# Altium footprint library rt10.PcbLib: 64 footprints (part 3 of 4)
Each footprint in its own frame and in the unit in brackets; x right, y up, seen from the top. Pads: shape width x height; smd on the part's side, far side on the other; paste and mask are expansions set on the pad; w line width, h text height; cw(c..) or ccw(c..) is an arc to the next point about the centre after c.
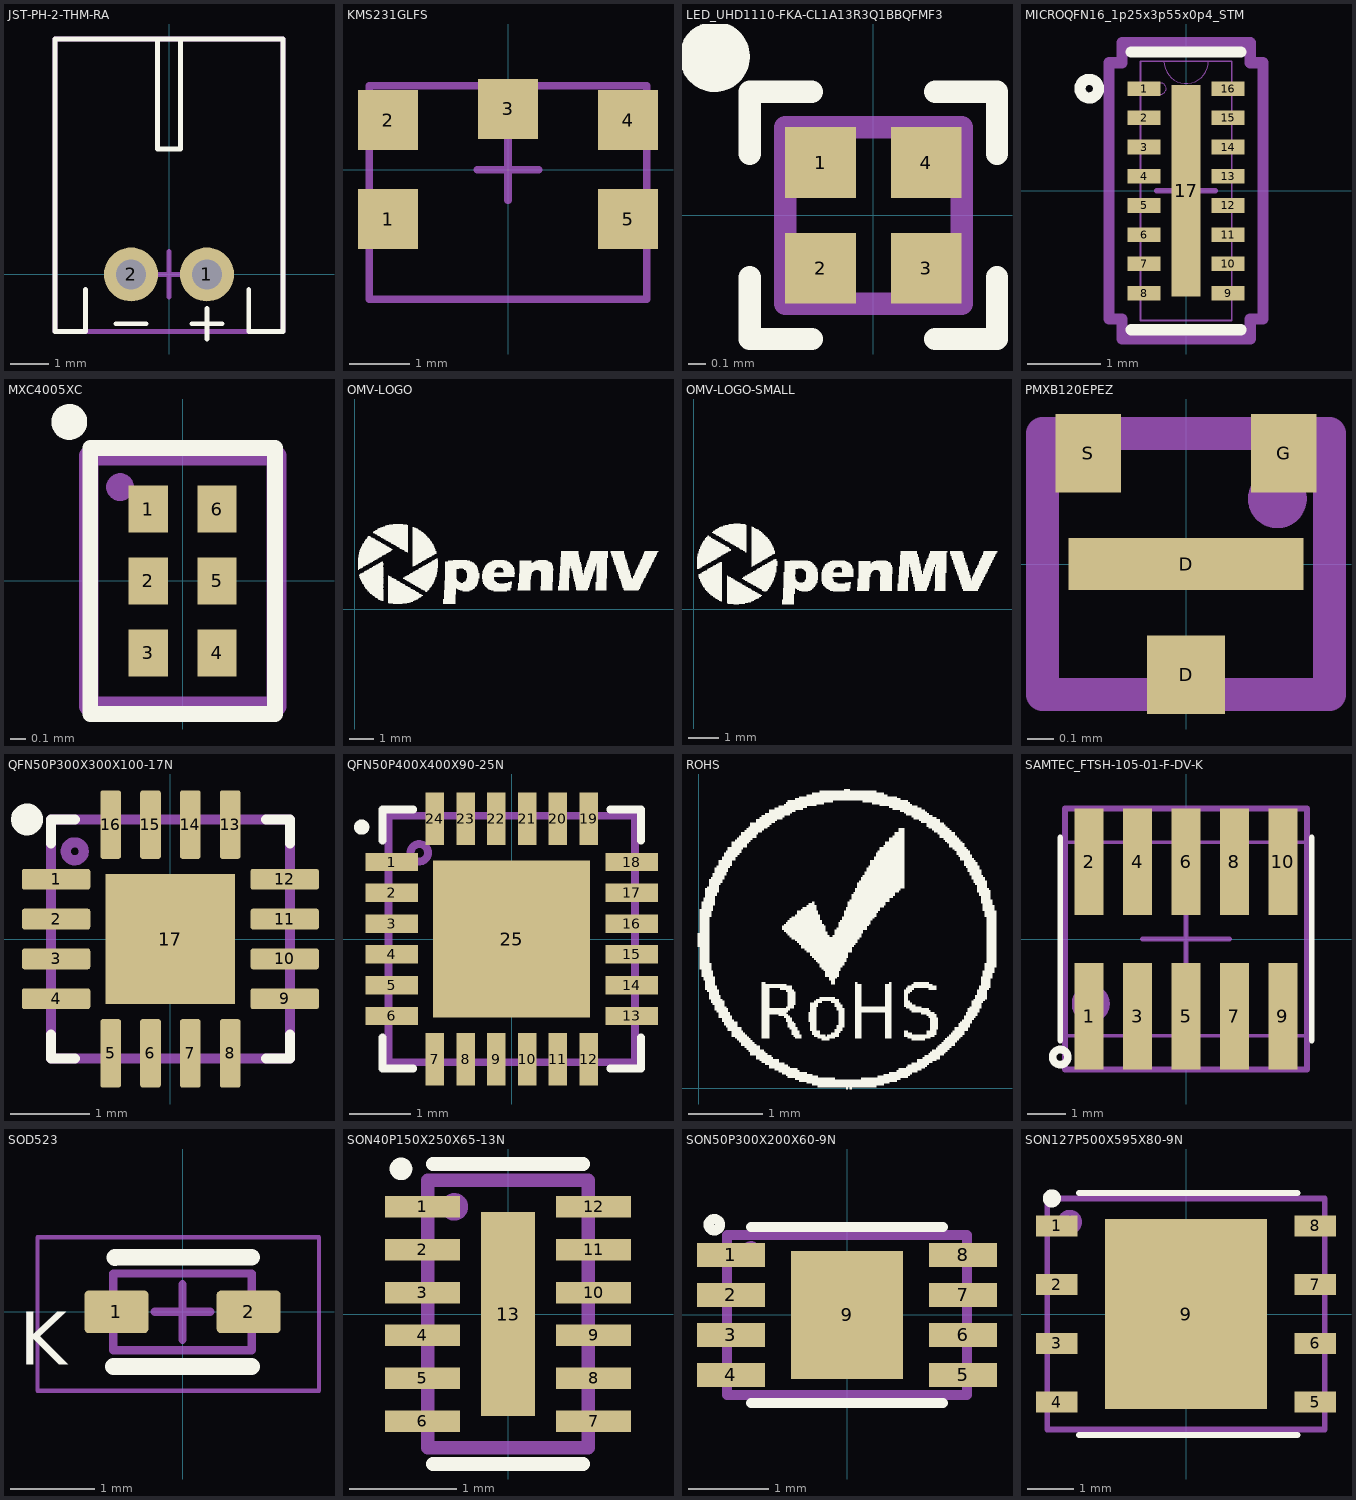
[diagram p2: the footprints below, top view; thin cyan lines are the x and y axes]

## JST-PH-2-THM-RA [mil] "JST-PH-2-THM-RA"
pads (2):
  round 56 hole 31.5: 1(39.37,0) 2(-39.37,0)
Top Overlay:
  lines w5: -86.61,-15.75 -86.61,-59.06 -118.11,-59.06 -118.11,244.09 118.11,244.09 118.11,-59.06 86.61,-59.06 82.68,-59.06 82.68,-15.75 ; -55.12,-51.18 -23.62,-51.18 ; -11.81,244.09 -11.81,129.92 11.81,129.92 11.81,244.09 ; 23.62,-51.18 55.12,-51.18 ; 39.37,-66.93 39.37,-35.43
Mechanical 13:
  lines w5: -23.62,0 0,0 ; 0,-23.62 0,0 ; 0,23.62 0,0 ; 23.62,0 0,0 ; -118.11,-59.06 118.11,-59.06 118.11,244.09 -118.11,244.09 -118.11,-59.06
  text ".designator" at -90.55,49.2 h25
3D body "c-440055-2-b3-3d.stp": height 195.38, standoff -133.36, extent -118.11,-59.06 118.11,244.09

## KMS231GLFS [mm]
pads (5):
  rect 1x1 smd: 1(-2,-0.825) 2(-2,0.825) 3(0,1.016) 4(2,0.825) 5(2,-0.825)
Mechanical 13:
  lines w0.127: -0.508,0 0,0 ; 0,-0.508 0,0 ; 0,0.508 0,0 ; 0.508,0 0,0 ; -2.311,-2.159 -2.311,1.397 2.311,1.397 2.311,-2.159 -2.311,-2.159
  text ".designator" at -2.108,-2.277 h0.64
3D body "KMS231GLFS.stp": height 1.43, standoff -0.01, extent -2.3,-2.15 2.3,1.4

## LED_UHD1110-FKA-CL1A13R3Q1BBQFMF3 [mm] "LED_UHD1110-FKA-CL1A13R3Q1BBQFMF3"
pads (4):
  rect 0.4x0.4 smd: 1(-0.3,0.3) 2(-0.3,-0.3) 3(0.3,-0.3) 4(0.3,0.3)
Top Overlay:
  circle w0.2: c-0.9,0.9 r0.1
  lines w0.127: -0.7,-0.35 -0.7,-0.7 -0.35,-0.7 ; -0.7,0.35 -0.7,0.7 -0.35,0.7 ; 0.35,-0.7 0.7,-0.7 0.7,-0.35 ; 0.35,0.7 0.7,0.7 0.7,0.35
Mechanical 13:
  circle w0.127: c-0.3,0.3 r0.06
  lines w0.127: -0.5,-0.5 0.5,-0.5 0.5,0.5 -0.5,0.5 -0.5,-0.5
  text ".designator" at -0.7,0.35 h0.64
3D body: height 0.62, standoff 0, extent 0.2,-0.2 0.357,0.2
3D body: height 0.62, standoff 0, extent -0.35,-0.3 -0.161,-0.05
3D body: height 0.62, standoff 0, extent -0.34,0.049 -0.155,0.3
3D body: height 0.6, standoff 0, extent -0.5,-0.5 0.5,0.5

## MICROQFN16_1p25x3p55x0p4_STM [mm]
pads (17):
  rect 0.45x0.2 smd paste+0 mask+0: 1(-0.575,1.4) 2(-0.575,1) 3(-0.575,0.6) 4(-0.575,0.2) 5(-0.575,-0.2) 6(-0.575,-0.6) 7(-0.575,-1) 8(-0.575,-1.4) 9(0.575,-1.4) 10(0.575,-1) 11(0.575,-0.6) 12(0.575,-0.2) 13(0.575,0.2) 14(0.575,0.6) 15(0.575,1) 16(0.575,1.4)
  rect 0.4x2.9 smd paste-0.2 mask+0: 17(0,0)
Top Layer:
  region: 0,-1.45
  region: 0,1.45
Top Overlay:
  circle w0.152: c-1.327,1.4 r0.127
  lines w0.152: -0.752,-1.902 0.752,-1.902 ; -0.752,1.902 0.752,1.902
Top Paste:
  region: 0.1,-0.1 -0.1,-0.1 -0.1,-1.35 0.1,-1.35
  region: 0.1,1.35 -0.1,1.35 -0.1,0.1 0.1,0.1
Top Solder:
  region: 0,-1.45
  region: 0,1.45
Mechanical 13:
  circle w0: c-0.35,1.4 r0.076
  lines w0: -0.305,1.775 ccw(c0,1.775) 0.305,1.775
  lines w0.025: -0.625,-1.775 -0.625,1.775 0.625,1.775 0.625,-1.775 -0.625,-1.775
  lines w0.076: -0.4,0 0,0 ; 0,-0.4 0,0 ; 0,0.4 0,0 ; 0.4,0 0,0
  text ".designator" at 1.75,-1.7 h0.64
Mechanical 15:
  lines w0.152: -1.054,-1.754 -0.879,-1.754 -0.879,-2.029 0.879,-2.029 0.879,-1.754 1.054,-1.754 1.054,1.754 0.879,1.754 0.879,2.029 -0.879,2.029 -0.879,1.754 -1.054,1.754 -1.054,-1.754
3D body "MICROQFN16_1p25x3p55x0p4_STM.step": height 0.55, standoff 0, extent -0.625,-1.775 0.625,1.775

## MXC4005XC [mm] "MXC4005XC"
pads (6):
  rect 0.25x0.3 smd: 1(-0.22,0.46) 2(-0.22,0) 3(-0.22,-0.46) 4(0.22,-0.46) 5(0.22,0) 6(0.22,0.46)
Top Overlay:
  circle w0.127: c-0.724,1.016 r0.051
  lines w0.1: -0.59,-0.85 0.59,-0.85 0.59,0.85 -0.59,0.85 -0.59,-0.85
Mechanical 13:
  circle w0.127: c-0.4,0.6 r0.025
  lines w0.127: -0.6,-0.8 -0.6,0.8 0.6,0.8 0.6,-0.8 -0.6,-0.8
  text ".designator" at 0.75,-0.7 h0.64
3D body: height 0.62, standoff 0, extent -0.6,-0.8 0.6,0.8

## OMV-LOGO [mm] "OMV-LOGO"
Top Overlay:
  drawing of 881 lines, arcs and shapes, not listed

## OMV-LOGO-SMALL [mm] "OMV-LOGO-SMALL"
Top Overlay:
  drawing of 701 lines, arcs and shapes, not listed

## PMXB120EPEZ [mm]
pads (4):
  rect 0.3x0.3 smd mask+0.05: D(0,-0.425)
  rect 0.9x0.2 smd mask+0.05: D(0,0)
  rect 0.25x0.3 smd mask+0.05: G(0.375,0.425) S(-0.375,0.425)
Mechanical 13:
  circle w0.127: c0.35,0.25 r0.049
  lines w0.127: -0.55,-0.5 -0.55,0.5 0.55,0.5 0.55,-0.5 -0.55,-0.5
  text ".designator" at -0.4,-0.725 h0.64
3D body: height 0.4, standoff 0, extent -0.55,-0.5 0.55,0.5

## QFN50P300X300X100-17N [mil] "QFN50P300X300X100-17N"
pads (17):
  rrect25% 33.86x10.24 smd mask+2: 1(-56.5,29.53) 2(-56.5,9.84) 3(-56.5,-9.84) 4(-56.5,-29.53) 9(56.5,-29.53) 10(56.5,-9.84) 11(56.5,9.84) 12(56.5,29.53)
  rrect25% 10.24x33.86 smd mask+2: 5(-29.53,-56.5) 6(-9.84,-56.5) 7(9.84,-56.5) 8(29.53,-56.5) 13(29.53,56.5) 14(9.84,56.5) 15(-9.84,56.5) 16(-29.53,56.5)
  rect 64x64 smd paste+0 mask+2: 17(0,0)
Top Overlay:
  circle w7.87: c-70.87,59.06 r3.94
  lines w5: -59.06,-47.24 -59.06,-59.06 -47.24,-59.06 ; -59.06,47.24 -59.06,59.06 -47.24,59.06 ; 47.24,-59.06 59.06,-59.06 59.06,-47.24 ; 47.24,59.06 59.06,59.06 59.06,47.24
Top Paste:
  region: -20.87,-20.87 -20.87,20.87 20.87,20.87 20.87,-20.87
Mechanical 13:
  circle w5: c-47.24,43.31 r4.46
  lines w5: -11.81,0 0,0 ; 0,-11.81 0,0 ; 0,11.81 0,0 ; 11.81,0 0,0 ; -59.06,-59.06 59.06,-59.06 59.06,59.06 -59.06,59.06 -59.06,-59.06
  text ".designator" at -55.12,-64.97 h25
3D body: height 39.37, standoff 0, extent -59.06,-59.06 59.06,59.06

## QFN50P400X400X90-25N [mm] "QFN50P400X400X90-25N"
pads (25):
  rect 0.85x0.3 smd: 1(-1.95,1.25) 2(-1.95,0.75) 3(-1.95,0.25) 4(-1.95,-0.25) 5(-1.95,-0.75) 6(-1.95,-1.25) 13(1.95,-1.25) 14(1.95,-0.75) 15(1.95,-0.25) 16(1.95,0.25) 17(1.95,0.75) 18(1.95,1.25)
  rect 0.3x0.85 smd: 7(-1.25,-1.95) 8(-0.75,-1.95) 9(-0.25,-1.95) 10(0.25,-1.95) 11(0.75,-1.95) 12(1.25,-1.95) 19(1.25,1.95) 20(0.75,1.95) 21(0.25,1.95) 22(-0.25,1.95) 23(-0.75,1.95) 24(-1.25,1.95)
  rect 2.55x2.55 smd: 25(0,0)
Top Overlay:
  circle w0.127: c-2.436,1.816 r0.06
  lines w0.127: -2.1,-1.6 -2.1,-2.1 -1.6,-2.1 ; -2.1,1.6 -2.1,2.1 -1.6,2.1 ; 1.6,-2.1 2.1,-2.1 2.1,-1.6 ; 1.6,2.1 2.1,2.1 2.1,1.6
Mechanical 13:
  circle w0.127: c-1.5,1.4 r0.142
  lines w0.127: -0.3,0 0,0 ; 0,-0.3 0,0 ; 0,0.3 0,0 ; 0.3,0 0,0 ; -2,-2 2,-2 2,2 -2,2 -2,-2
  text ".designator" at -1.8,-2.05 h0.64
3D body: height 1, standoff 0, extent -2,-2 2,2

## ROHS [mm] "ROHS"
Top Overlay:
  drawing of 599 lines, arcs and shapes, not listed

## SAMTEC_FTSH-105-01-F-DV-K [mil] "Connector Header Surface Mount 10 position 0.050\" (1.27mm)"
pads (10):
  rect 30x110 smd paste+0 mask+0: 1(-100,-80) 2(-100,80) 3(-50,-80) 4(-50,80) 5(0,-80) 6(0,80) 7(50,-80) 8(50,80) 9(100,-80) 10(100,80)
Top Overlay:
  circle w7.87: c-130,-122.05 r7.87
  lines w6: -130,-105 -130,105 ; 130,-105 130,105
Mechanical 13:
  circle w7.87: c-98.43,-66.93 r15.75
  lines w3.94: -125,-100 125,-100 125,100 -125,100 -125,-100
  lines w5: -35.43,0 0,0 ; 0,-35.43 0,0 ; 0,35.43 0,0 ; 35.43,0 0,0
  text ".designator" at -22.64,-66.93 h15.75
Mechanical 15:
  lines w5: -45.28,0 0,0 ; 0,-45.28 0,0 ; 0,45.28 0,0 ; 45.28,0 0,0
  lines w6: -125,-135 125,-135 125,-100 125,100 125,135 -125,135 -125,100 -125,-100 -125,-135
3D body "FTSH-105-01-F-DV-K.stp": height 241.5, standoff 0.5, extent -124.99,-115 125.01,115

## SOD523 [mil]
pads (2):
  rrect20% 30x20 smd: 1(-31,0) 2(31,0)
Top Overlay:
  lines w7.87: -32.48,-25.59 32.48,-25.59 ; -31.61,25.47 32.48,25.59
  text "K" at -76.68,-24.8 h25
Mechanical 13:
  lines w3.94: -32.48,-18 -32.48,18 32.48,18 32.48,-18 -32.48,-18
  text "K" at -28.04,-19.57 h25
  text ".designator" at -15,-13 h12
Mechanical 15:
  lines w1.97: -68,-37 -68,35 64,35 64,-37 -68,-37
  lines w3.94: -13,0 0,0 ; 0,-13 0,0 ; 0,13 0,0 ; 13,0 0,0
3D body "SC-79.stp": height 27.56, standoff 0, extent -33.46,-17.43 33.47,18.01

## SON40P150X250X65-13N [mil] "SON40P150X250X65-13N"
pads (13):
  rect 27.56x7.87 smd: 1(-31.5,39.37) 2(-31.5,23.62) 3(-31.5,7.87) 4(-31.5,-7.87) 5(-31.5,-23.62) 6(-31.5,-39.37) 7(31.5,-39.37) 8(31.5,-23.62) 9(31.5,-7.87) 10(31.5,7.87) 11(31.5,23.62) 12(31.5,39.37)
  rect 19.69x74.8 smd: 13(0,0)
Top Overlay:
  circle w5: c-39.32,53.32 r1.66
  lines w5: -27.56,-55.12 27.56,-55.12 ; -27.56,55.12 27.56,55.12
Mechanical 13:
  circle w5: c-19.68,39.37 r2.54
  lines w5: -29.53,-49.21 -29.53,49.21 29.53,49.21 29.53,-49.21 -29.53,-49.21
  text ".designator" at 31.01,-47.34 h25
3D body: height 23.62, standoff 0, extent -29.53,-49.21 29.53,49.21

## SON50P300X200X60-9N [mm] "SON50P300X200X60-9N"
pads (9):
  rect 0.85x0.3 smd: 1(-1.45,0.75) 2(-1.45,0.25) 3(-1.45,-0.25) 4(-1.45,-0.75) 5(1.45,-0.75) 6(1.45,-0.25) 7(1.45,0.25) 8(1.45,0.75)
  rect 1.4x1.6 smd: 9(0,0)
Top Overlay:
  circle w0.127: c-1.659,1.127 r0.071
  lines w0.127: -1.2,-1.1 1.2,-1.1 ; -1.2,1.1 1.2,1.1
Mechanical 13:
  circle w0.127: c-1.2,0.8 r0.057
  lines w0.127: -1.5,-1 -1.5,1 1.5,1 1.5,-1 -1.5,-1
  text ".designator" at -1.3,-1.15 h0.64
3D body: height 0.6, standoff 0, extent -1.5,-1 1.5,1

## SON127P500X595X80-9N [mil] "SON127P500X595X80-9N"
pads (9):
  rect 35.43x17.72 smd: 1(-110,75) 2(-110,25) 3(-110,-25) 4(-110,-75) 5(110,-75) 6(110,-25) 7(110,25) 8(110,75)
  rect 137.8x161.42 smd: 9(0,0)
Top Overlay:
  circle w10: c-114.17,98.43 r2.66
  lines w5: -91,-103 95,-103 ; -91,103 95,103
Mechanical 13:
  circle w5: c-98.96,78.32 r7.87
  lines w5: -19.68,0 0,0 ; 0,-19.68 0,0 ; 0,19.68 0,0 ; 19.68,0 0,0 ; -118.11,-98.43 118.11,-98.43 118.11,98.43 -118.11,98.43 -118.11,-98.43
  text ".designator" at -102.36,-100.4 h25
3D body: height 39.37, standoff 0, extent -118.11,-98.43 118.11,98.43